# Altium footprint library 2.52-直插元件.PcbLib: 467 footprints (part 26 of 30)
Each footprint in its own frame and in the unit in brackets; x right, y up, seen from the top. Pads: shape width x height; smd on the part's side, far side on the other; paste and mask are expansions set on the pad; w line width, h text height; cw(c..) or ccw(c..) is an arc to the next point about the centre after c.
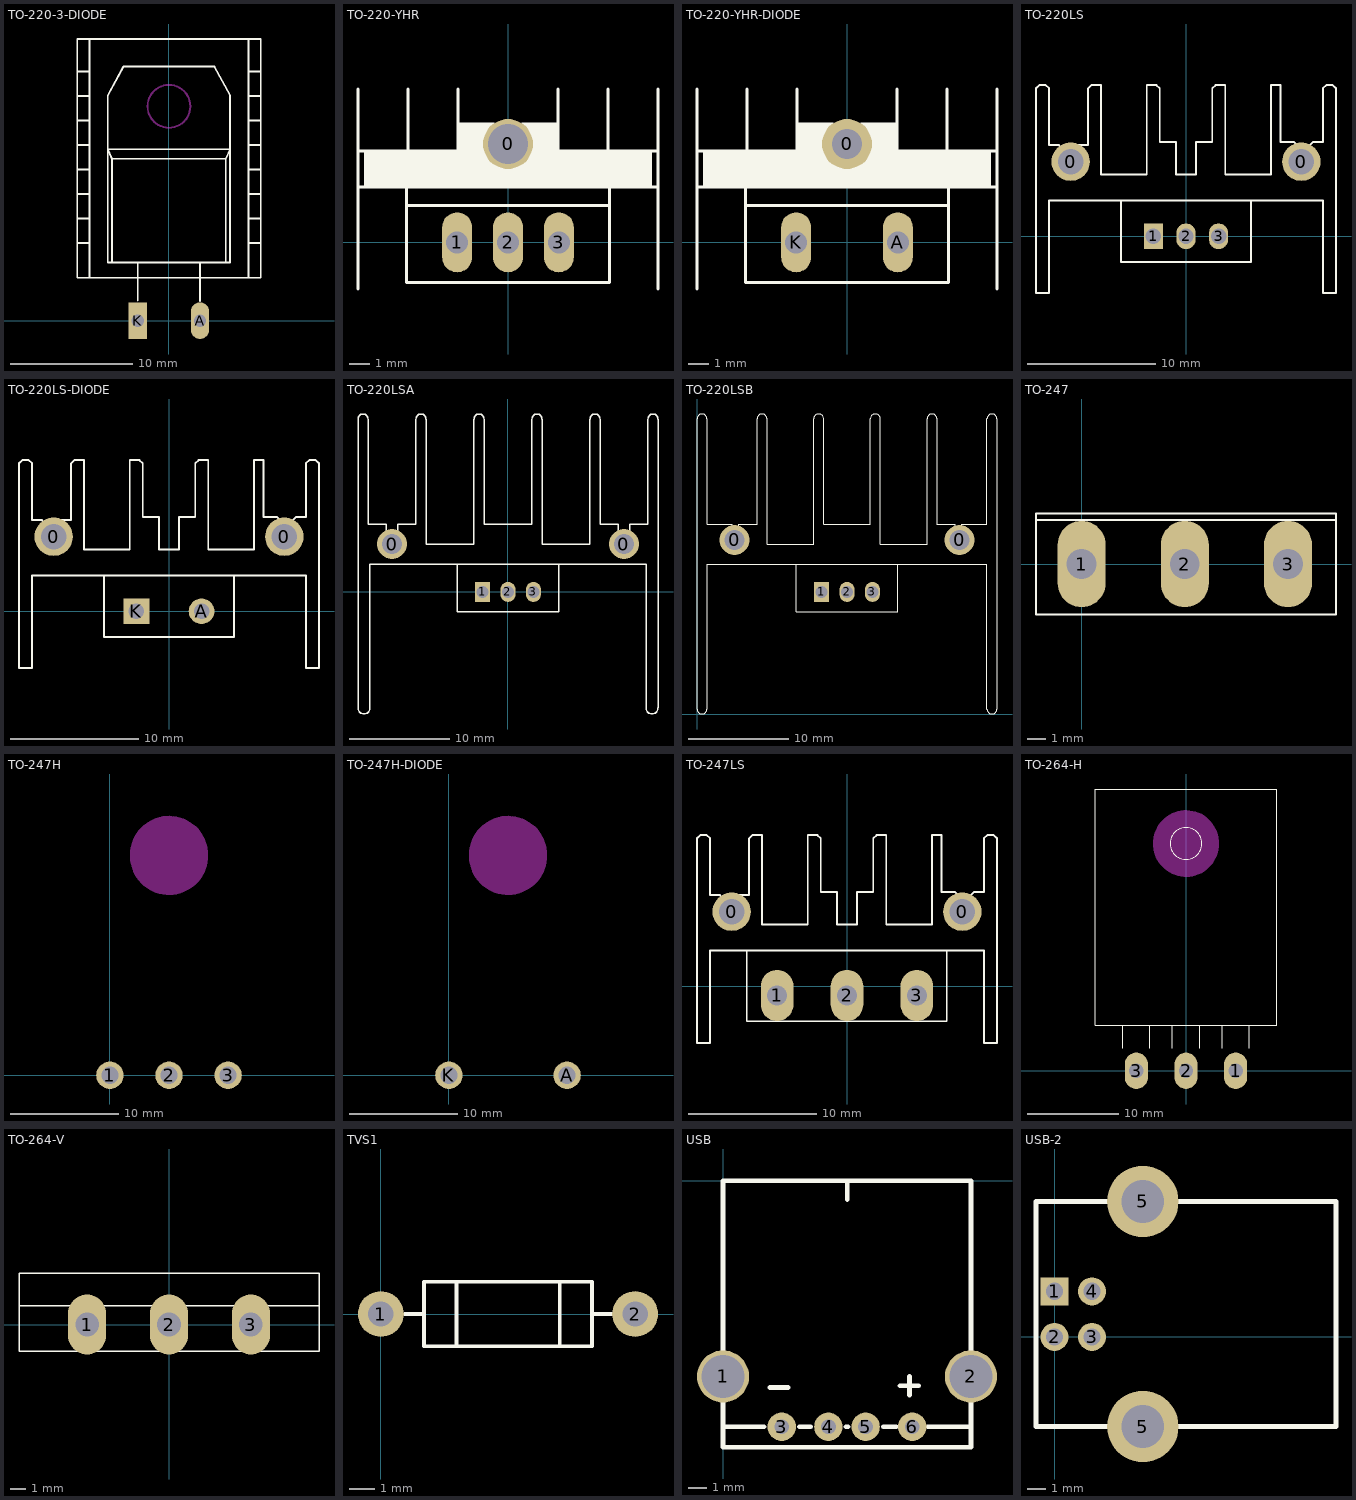
[diagram p25: the footprints below, top view; thin cyan lines are the x and y axes]

## TO-220-3-DIODE [mm]
pads (2):
  oval 1.5x3 hole 1: A(2.54,0)
  rect 1.5x3 hole 1: K(-2.54,0)
Top Overlay:
  lines w0.15: -7.493,6.343 -6.493,6.343 ; -7.493,8.343 -6.493,8.343 ; -7.493,10.343 -6.493,10.343 ; -7.493,12.343 -6.493,12.343 ; -7.493,14.343 -6.493,14.343 ; -7.493,16.343 -6.493,16.343 ; -7.493,18.343 -6.493,18.343 ; -7.493,20.343 -6.493,20.343 ; -6.493,3.505 -6.493,23.005 ; -5,14 5,14 ; -5,14.005 -4.644,13.217 ; -5,18.377 -5,4.75 5,4.75 5,18.377 ; -5,18.388 -3.712,20.75 3.712,20.75 5,18.388 ; -4.644,4.75 -4.644,13.217 ; -2.54,1.654 -2.54,4.75 ; 2.54,1.611 2.54,4.75 ; 4.644,4.75 4.644,13.217 ; 5,14.005 4.644,13.217 ; 6.507,3.505 6.507,23.005 ; 6.507,6.343 7.507,6.343 ; 6.507,8.343 7.507,8.343 ; 6.507,10.343 7.507,10.343 ; 6.507,12.343 7.507,12.343 ; 6.507,14.343 7.507,14.343 ; 6.507,16.343 7.507,16.343 ; 6.507,18.343 7.507,18.343 ; 6.507,20.343 7.507,20.343 ; -4.644,13.217 4.644,13.217 ; -7.493,3.505 7.507,3.505 7.507,23.005 -7.493,23.005 -7.493,3.505
Keep-Out Layer:
  circle w0.15: c0,17.5 r1.75
  circle w0.15: c0.007,17.505 r1.75
3D body "User Library-Disipador TO.step": height 10, standoff 0, extent -8.493,1.491 8.507,21.491

## TO-220-YHR [mm] "封装库来自淘宝卖家 ID：黄晶宝石"
pads (4):
  round 2.5 hole 2: 0(0,4.917)
  oval 1.5x3 hole 1.1: 1(-2.54,0) 2(0,0) 3(2.54,0)
Top Overlay:
  region: 2.5,5.994 0.667,5.994 0.667,4.039 2.5,4.039
  rectangle: -2.5,4.039 -0.667,5.994
  rectangle: -7.195,2.767 7.207,4.567
  lines w0.15: -7.5,-2.333 -7.5,7.667 ; -7.5,2.767 7.5,2.767 ; -7.5,4.567 7.5,4.567 ; -5.08,1.848 5.08,1.848 ; -5,4.567 -5,7.667 ; -2.5,4.567 -2.5,7.667 ; 2.5,4.567 2.5,7.667 ; 5,4.567 5,7.667 ; 7.5,-2.333 7.5,7.667 ; -5.08,-2 -5.08,2.79 5.08,2.79 5.08,-2 -5.08,-2
3D body "User Library-heatsink TO126.step": height 25, standoff -3.8, extent -7.391,-2.578 7.391,8.223

## TO-220-YHR-DIODE [mm] "封装库来自淘宝卖家 ID：黄晶宝石"
pads (3):
  round 2.5 hole 1.5: 0(0,4.917)
  oval 1.5x3 hole 1.1: A(2.54,0) K(-2.54,0)
Top Overlay:
  region: 2.5,5.994 0.667,5.994 0.667,4.039 2.5,4.039
  rectangle: -2.5,4.039 -0.667,5.994
  rectangle: -7.195,2.767 7.207,4.567
  lines w0.15: -7.5,-2.333 -7.5,7.667 ; -7.5,2.767 7.5,2.767 ; -7.5,4.567 7.5,4.567 ; -5.08,1.848 5.08,1.848 ; -5,4.567 -5,7.667 ; -2.5,4.567 -2.5,7.667 ; 2.5,4.567 2.5,7.667 ; 5,4.567 5,7.667 ; 7.5,-2.333 7.5,7.667 ; -5.08,-2 5.08,-2 5.08,2.79 -5.08,2.79 -5.08,-2
3D body "User Library-heatsink TO126.step": height 25, standoff -3.8, extent -7.391,-2.578 7.391,8.223

## TO-220LS [mm] "淘宝ID:黄晶宝石   店铺网址:https://shop463601444.taobao.com"
pads (5):
  round 3 hole 2: 0(-9,5.822) 0(9,5.822)
  rect 1.5x2 hole 1.2: 1(-2.54,0)
  oval 1.5x2 hole 1.2: 2(0,0) 3(2.54,0)
Top Overlay:
  lines w0.15: -9.668,6.018 -9.668,6.854 -9.922,7.108 -10.684,7.108 -10.684,11.536 -10.938,11.79 -11.446,11.79 -11.7,11.536 -11.7,2.79 -11.7,2.536 -11.7,-4.41 -10.684,-4.41 -10.684,2.79 10.684,2.79 10.684,-4.41 11.7,-4.41 11.7,11.536 11.446,11.79 10.938,11.79 10.684,11.536 10.684,7.362 9.922,7.362 9.668,7.108 9.668,6.079 ; -8.652,6.346 -8.652,6.854 -8.398,7.108 -7.636,7.108 -7.636,11.536 -7.382,11.79 -6.62,11.79 -6.62,4.822 -3.064,4.822 -3.064,11.79 -2.302,11.79 -2.048,11.536 -2.048,7.362 -0.778,7.362 -0.778,4.822 0.778,4.822 0.778,7.362 2.048,7.362 2.048,11.536 2.302,11.79 3.064,11.79 3.064,4.822 6.62,4.822 6.62,11.79 7.382,11.79 7.382,7.362 8.398,7.362 8.652,7.108 8.652,6.346 ; -5.08,2.79 -5.08,-2 5.08,-2 5.08,2.79
3D body "User Library-M3x8.STEP": height 20.6, standoff 15, extent -2.8,-0.35 2.8,9.135
3D body "User Library-POWER MOSFET, NON-SURFACE-MOUNT.step": height 20.8, standoff -7.58, extent -4.834,-1.996 4.818,2.504
3D body "User Library-heat sink-1.step": height 30.62, standoff 0, extent -11.45,-4.535 11.45,11.865

## TO-220LS-DIODE [mm]
pads (4):
  round 3 hole 2: 0(-9,5.822) 0(9,5.822)
  round 2 hole 1.2: A(2.54,0)
  rect 2x2 hole 1.2: K(-2.54,0)
Top Overlay:
  lines w0.15: -9.668,6.018 -9.668,6.854 -9.922,7.108 -10.684,7.108 -10.684,11.536 -10.938,11.79 -11.446,11.79 -11.7,11.536 -11.7,2.79 -11.7,2.536 -11.7,-4.41 -10.684,-4.41 -10.684,2.79 10.684,2.79 10.684,-4.41 11.7,-4.41 11.7,11.536 11.446,11.79 10.938,11.79 10.684,11.536 10.684,7.362 9.922,7.362 9.668,7.108 9.668,6.079 ; -8.652,6.346 -8.652,6.854 -8.398,7.108 -7.636,7.108 -7.636,11.536 -7.382,11.79 -6.62,11.79 -6.62,4.822 -3.064,4.822 -3.064,11.79 -2.302,11.79 -2.048,11.536 -2.048,7.362 -0.778,7.362 -0.778,4.822 0.778,4.822 0.778,7.362 2.048,7.362 2.048,11.536 2.302,11.79 3.064,11.79 3.064,4.822 6.62,4.822 6.62,11.79 7.382,11.79 7.382,7.362 8.398,7.362 8.652,7.108 8.652,6.346 ; -5.08,2.79 -5.08,-2 5.08,-2 5.08,2.79
3D body "User Library-heat sink-1.step": height 30.62, standoff 0, extent -11.45,-4.535 11.45,11.865
3D body "User Library-TO220-D.STEP": height 20.8, standoff -7.58, extent -4.826,-2.075 4.826,2.425
3D body "User Library-M3x8.STEP": height 20.6, standoff 15, extent -2.8,-0.35 2.8,9.135

## TO-220LSA [mm]
pads (5):
  round 3 hole 2: 0(-11.6,4.79) 0(11.6,4.79)
  rect 1.5x2 hole 1.2: 1(-2.54,0)
  oval 1.5x2 hole 1.2: 2(0,0) 3(2.54,0)
Top Overlay:
  lines w0.15: -12.156,5.446 ccw(c-11.6,4.79) -11.035,5.438 ; -12.154,5.446 -12.154,6.79 -14,6.79 -14,17.29 ccw(c-14.5,17.29) -15,17.29 -15,2.79 -15,-11.61 ccw(c-14.4,-11.61) -13.8,-11.61 -13.8,2.79 13.8,2.79 13.8,-11.61 ccw(c14.4,-11.61) 15,-11.61 15,2.79 15,17.29 ccw(c14.5,17.29) 14,17.29 14,6.79 12.154,6.79 12.154,5.438 ; -11.046,5.438 -11.046,6.79 -9.2,6.79 -9.2,17.29 cw(c-8.7,17.29) -8.2,17.29 -8.2,4.79 -3.4,4.79 -3.4,17.29 cw(c-2.9,17.29) -2.4,17.29 -2.4,6.79 2.4,6.79 2.4,17.29 cw(c2.9,17.29) 3.4,17.29 3.4,4.79 8.2,4.79 8.2,17.29 cw(c8.7,17.29) 9.2,17.29 9.2,6.79 11.046,6.79 11.046,5.446 ; -5.08,2.79 -5.08,-2 5.08,-2 5.08,2.79 ; 11.044,5.446 ccw(c11.6,4.79) 12.165,5.438
3D body "User Library-POWER MOSFET, NON-SURFACE-MOUNT.step": height 20.8, standoff -7.58, extent -4.834,-1.996 4.818,2.504
3D body "User Library-M3x8.STEP": height 20.6, standoff 15, extent -2.8,-0.35 2.8,9.135

## TO-220LSB [mm]
pads (5):
  round 3 hole 2: 0(3.75,17.4) 0(26.25,17.4)
  rect 1.5x2 hole 1.2: 1(12.468,12.21)
  oval 1.5x2 hole 1.2: 2(15.008,12.21) 3(17.548,12.21)
Top Overlay:
  lines w0.1: 9.928,15 9.928,10.21 20.088,10.21 20.088,15 ; 24,18.992 25.8,18.992 25.8,17.861 ccw(c26.25,17.392) 26.5,17.992 ; 24,19 24,29.5 ccw(c23.5,29.5) 23,29.5 23,17 18.333,17 18.333,29.5 ccw(c17.833,29.5) 17.333,29.5 17.333,19 12.667,19 12.667,29.5 ccw(c12.167,29.5) 11.667,29.5 11.667,17 7,17 7,29.5 ccw(c6.5,29.5) 6,29.5 6,19 4.2,19 4.2,17.869 cw(c3.75,17.4) 3.5,18 3.5,19 1,19 1,19.01 1,29.5 ccw(c0.5,29.5) 0,29.5 0,0.5 ccw(c0.5,0.5) 1,0.5 1,15 29,15 29,0.5 ccw(c29.5,0.5) 30,0.5 30,29.5 ccw(c29.5,29.5) 29,29.5 29,19.002 ; 26.5,17.992 26.5,18.992 29,18.992 29,19.002 ; 29,19 29,19.002
3D body "User Library-M3x8.STEP": height 20.6, standoff 15, extent 12.2,11.86 17.8,21.345
3D body "User Library-POWER MOSFET, NON-SURFACE-MOUNT.step": height 20.8, standoff -7.58, extent 10.174,10.214 19.826,14.714
3D body: height 8, standoff -5, extent 25.5,16.643 26.994,18.14
3D body: height 8, standoff -5, extent 3.006,16.652 4.5,18.149
3D body: height 25, standoff 0, extent 29,0.5 30,29.5
3D body: height 25, standoff 0, extent 0.004,0.5 1,29.5
3D body: height 25, standoff 0, extent 4.2,17.869 6,19
3D body: height 25, standoff 0, extent 1,18 3.5,19
3D body: height 25, standoff 0, extent 1,15.008 3.74,17.405
3D body: height 25, standoff 0, extent 3.74,15.008 6,17.413
3D body: height 25, standoff 0, extent 4.2,17.413 6,17.869
3D body: height 25, standoff 0, extent 1,17.405 3.5,18
3D body: height 25, standoff 0, extent 26.5,17.397 29,17.992
3D body: height 25, standoff 0, extent 24,17.405 25.8,17.861
3D body: height 25, standoff 0, extent 24,15 26.26,17.405
3D body: height 25, standoff 0, extent 26.26,15 29,17.397
3D body: height 25, standoff 0, extent 26.5,17.992 29,18.992
3D body: height 25, standoff 0, extent 24,17.861 25.8,18.992
3D body: height 25, standoff 0, extent 6,14.993 24,29.5
3D body: height 25, standoff 0, extent 0.004,0.001 1,0.999
3D body: height 25, standoff 0, extent 29.004,0.001 30,0.999
3D body: height 25, standoff 0, extent 29.004,29.001 30,29.999
3D body: height 25, standoff 0, extent 23.004,29.001 24,29.999
3D body: height 25, standoff 0, extent 17.337,29.001 18.333,29.999
3D body: height 25, standoff 0, extent 11.671,29.001 12.667,29.999
3D body: height 25, standoff 0, extent 6.004,29.001 7,29.999
3D body: height 25, standoff 0, extent 0.004,29.001 1,29.999

## TO-247 [mil]
pads (3):
  oval 100x180 hole 62: 1(0,0) 2(215,0) 3(430,0)
Top Overlay:
  lines w3.94: -95,91.42 529.33,91.42 530,90.75 ; -95,-105 -95,105 530,105 530,-105 -95,-105
3D body "User Library-IRFP2907.step": height 984.25, standoff -387.64, extent -90.12,-98.43 520.12,98.43

## TO-247H [mm]
pads (3):
  round 2.54 hole 1.575: 1(0,0) 2(5.461,0) 3(10.922,0)
Bottom Overlay:
  circle w0.2: c5.461,20.32 r1.5
  lines w0.2: -2.794,16.51 -0.889,18.415 ; -2.794,17.357 -1.524,18.627 ; -2.794,23.283 -1.524,22.013 ; -2.794,24.13 -0.889,22.225 ; -2.794,24.765 13.716,24.765 ; -1.312,1.905 -1.312,5.08 ; 1.228,1.905 1.228,5.08 ; 4.191,1.905 4.191,5.08 ; 6.731,1.905 6.731,5.08 ; 9.694,1.905 9.694,5.08 ; 12.234,1.905 12.234,5.08 ; 13.716,16.51 11.811,18.415 ; 13.716,17.357 12.446,18.627 ; 13.716,23.283 12.446,22.013 ; 13.716,24.13 11.811,22.225 ; -1.524,18.627 -0.889,18.415 ; -1.524,18.627 -1.524,22.013 ; -1.524,22.013 -0.889,22.225 ; -0.889,18.415 -0.889,22.225 ; 11.811,18.415 12.446,18.627 ; 11.811,18.415 11.811,22.225 ; 11.811,22.225 12.446,22.013 ; 12.446,18.627 12.446,22.013 ; -2.794,5.08 -2.794,26.458 13.716,26.458 13.716,5.08 -2.794,5.08
  text "1" at 0.254,3.048 h1.27
  text "2" at 5.842,3.048 h1.27
  text "3" at 11.43,3.048 h1.27
Keep-Out Layer:
  board cut-out: 9.061,20.326 9.061,20.561 8.999,21.028 8.878,21.482 8.697,21.917 8.462,22.324 8.176,22.697 7.843,23.03 7.47,23.317 7.062,23.552 6.628,23.732 6.173,23.854 5.707,23.915 5.472,23.915 5.451,23.915 5.216,23.915 4.749,23.854 4.294,23.732 3.86,23.552 3.452,23.316 3.079,23.03 2.746,22.697 2.46,22.324 2.224,21.916 2.044,21.481 1.922,21.027 1.861,20.56 1.861,20.325 1.861,20.089 1.923,19.621 2.045,19.165 2.225,18.729 2.461,18.321 2.748,17.946 3.082,17.613 3.457,17.325 3.865,17.089 4.301,16.909 4.757,16.787 5.225,16.725 5.461,16.725 5.481,16.725 5.716,16.725 6.181,16.786 6.634,16.908 7.068,17.087 7.474,17.322 7.846,17.608 8.178,17.939 8.464,18.312 8.698,18.718 8.878,19.152 8.999,19.605 9.061,20.07 9.061,20.305
Keep-Out Layer:
  circle w0.1: c5.461,20.32 r3.6
3D body "TO-247H.STEP": height 8, standoff -3.9, extent -2.289,-0.3 13.211,25.82

## TO-247H-DIODE [mm]
pads (2):
  round 2.54 hole 1.575: A(10.922,0) K(0,0)
Bottom Overlay:
  circle w0.2: c5.461,20.32 r3.7
  lines w0.2: -2.794,16.51 -0.889,18.415 ; -2.794,17.357 -1.524,18.627 ; -2.794,23.283 -1.524,22.013 ; -2.794,24.13 -0.889,22.225 ; -2.794,24.765 13.716,24.765 ; -1.312,1.905 -1.312,5.08 ; 1.228,1.905 1.228,5.08 ; 4.191,1.905 4.191,5.08 ; 6.731,1.905 6.731,5.08 ; 9.694,1.905 9.694,5.08 ; 12.234,1.905 12.234,5.08 ; 13.716,16.51 11.811,18.415 ; 13.716,17.357 12.446,18.627 ; 13.716,23.283 12.446,22.013 ; 13.716,24.13 11.811,22.225 ; -1.524,18.627 -1.524,22.013 ; -1.524,18.627 -0.889,18.415 ; -1.524,22.013 -0.889,22.225 ; -0.889,18.415 -0.889,22.225 ; 11.811,18.415 11.811,22.225 ; 11.811,18.415 12.446,18.627 ; 11.811,22.225 12.446,22.013 ; 12.446,18.627 12.446,22.013 ; -2.794,5.08 13.716,5.08 13.716,26.458 -2.794,26.458 -2.794,5.08
  text "3" at 11.43,3.048 h1.27
  text "2" at 5.842,3.048 h1.27
  text "1" at 0.254,3.048 h1.27
Keep-Out Layer:
  board cut-out: 9.061,20.326 9.061,20.561 8.999,21.028 8.878,21.482 8.697,21.917 8.462,22.324 8.176,22.697 7.843,23.03 7.47,23.317 7.062,23.552 6.628,23.732 6.173,23.854 5.707,23.915 5.472,23.915 5.451,23.915 5.216,23.915 4.749,23.854 4.294,23.732 3.86,23.552 3.452,23.316 3.079,23.03 2.746,22.697 2.46,22.324 2.224,21.916 2.044,21.481 1.922,21.027 1.861,20.56 1.861,20.325 1.861,20.089 1.923,19.621 2.045,19.165 2.225,18.729 2.461,18.321 2.748,17.946 3.082,17.613 3.457,17.325 3.865,17.089 4.301,16.909 4.757,16.787 5.225,16.725 5.461,16.725 5.481,16.725 5.716,16.725 6.181,16.786 6.634,16.908 7.068,17.087 7.474,17.322 7.846,17.608 8.178,17.939 8.464,18.312 8.698,18.718 8.878,19.152 8.999,19.605 9.061,20.07 9.061,20.305
Keep-Out Layer:
  circle w0.1: c5.461,20.32 r3.6
3D body "TO-247D.STEP": height 1.9, standoff -10, extent -2.289,-0.3 13.211,25.82

## TO-247LS [mm]
pads (5):
  round 3 hole 2: 0(-9,5.822) 0(9,5.822)
  oval 2.54x4 hole 1.575: 1(-5.45,-0.71) 2(0,-0.71) 3(5.45,-0.71)
Top Overlay:
  lines w0.1: -7.8,2.79 -7.8,-2.71 7.8,-2.71 7.8,2.79
  lines w0.15: -9.668,6.018 -9.668,6.854 -9.922,7.108 -10.684,7.108 -10.684,11.536 -10.938,11.79 -11.446,11.79 -11.7,11.536 -11.7,2.79 -11.7,2.536 -11.7,-4.41 -10.684,-4.41 -10.684,2.79 10.684,2.79 10.684,-4.41 11.7,-4.41 11.7,11.536 11.446,11.79 10.938,11.79 10.684,11.536 10.684,7.362 9.922,7.362 9.668,7.108 9.668,6.079 ; -8.652,6.346 -8.652,6.854 -8.398,7.108 -7.636,7.108 -7.636,11.536 -7.382,11.79 -6.62,11.79 -6.62,4.822 -3.064,4.822 -3.064,11.79 -2.302,11.79 -2.048,11.536 -2.048,7.362 -0.778,7.362 -0.778,4.822 0.778,4.822 0.778,7.362 2.048,7.362 2.048,11.536 2.302,11.79 3.064,11.79 3.064,4.822 6.62,4.822 6.62,11.79 7.382,11.79 7.382,7.362 8.398,7.362 8.652,7.108 8.652,6.346
3D body "User Library-heat sink-1.step": height 30.62, standoff 0, extent -11.45,-4.485 11.45,11.915
3D body "User Library-M3x8.STEP": height 20.6, standoff 15, extent -2.8,-4.235 2.8,5.25
3D body "2SK2225.STEP": height 23, standoff -17.9, extent -7.767,-2.697 7.833,2.803

## TO-264-H [mil] "淘宝ID:黄晶宝石   店铺网址:https://shop463601444.taobao.com"
pads (3):
  oval 100x157.48 hole 62: 1(215,0) 2(0,0) 3(-215,0)
Top Overlay:
  circle w3.94: c0,984.25 r68.9
  lines w3.94: -274.06,98.43 -274.06,196.85 ; -155.94,98.43 -155.94,196.85 ; -59.06,98.43 -59.06,196.85 ; 59.06,98.43 59.06,196.85 ; 155.94,98.43 155.94,196.85 ; 274.06,98.43 274.06,196.85 ; -393.7,196.85 -393.7,1220.47 393.7,1220.47 393.7,196.85 -393.7,196.85
Keep-Out Layer:
  board cut-out: 141.73,984.48 141.73,993.74 139.31,1012.11 134.52,1030 127.43,1047.11 118.17,1063.16 106.89,1077.85 93.79,1090.95 79.1,1102.23 63.06,1111.49 45.94,1118.58 28.05,1123.37 9.69,1125.79 0.42,1125.79 -0.39,1125.79 -9.65,1125.79 -28.02,1123.37 -45.92,1118.57 -63.04,1111.48 -79.08,1102.22 -93.78,1090.94 -106.88,1077.84 -118.16,1063.14 -127.42,1047.1 -134.51,1029.98 -139.31,1012.08 -141.73,993.71 -141.73,984.45 -141.73,975.16 -139.3,956.74 -134.49,938.79 -127.38,921.63 -118.09,905.54 -106.78,890.8 -93.65,877.66 -78.91,866.35 -62.82,857.06 -45.65,849.95 -27.71,845.14 -9.29,842.72 0,842.72 0.79,842.72 10.03,842.72 28.35,845.13 46.19,849.91 63.26,856.98 79.26,866.22 93.92,877.46 106.98,890.53 118.23,905.19 127.47,921.19 134.54,938.25 139.32,956.1 141.73,974.42 141.73,983.65
Keep-Out Layer:
  circle w3.94: c0,984.25 r141.73
3D body "User Library-to264.STEP": height 393.7, standoff -318.9, extent -403.55,-9.02 403.54,1222.44

## TO-264-V [mil]
pads (3):
  oval 100x157.48 hole 62: 1(-215,0) 2(0,0) 3(215,0)
Top Overlay:
  lines w3.94: -393.7,49.21 393.7,49.21 ; -393.7,-70.87 393.7,-70.87 393.7,133.86 -393.7,133.86 -393.7,-70.87
3D body "User Library-to264.STEP": height 1170.26, standoff -639.94, extent -403.54,-70.87 403.54,133.86

## TVS1 [mm]
pads (2):
  round 1.8 hole 1: 1(0,0) 2(10,0)
Top Overlay:
  lines w0.15: 0.939,0 1.701,0 ; 2.971,-1.27 2.971,1.27 ; 7.035,-1.27 7.035,1.27 ; 8.305,0 9.067,0 ; 1.701,-1.27 8.305,-1.27 8.305,1.27 1.701,1.27 1.701,-1.27
3D body "TVS.STEP": height 2.86, standoff -2.5, extent -0.397,-1.362 10.403,1.362

## USB [mm]
pads (6):
  round 2.8 hole 2.3: 1(0,-10.5) 2(13.3,-10.5)
  round 1.524 hole 0.8: 3(3.15,-13.2) 4(5.65,-13.2) 5(7.65,-13.2) 6(10.15,-13.2)
Top Overlay:
  lines w0.254: 0,-13.2 2.2,-13.2 ; 2.5,-11.1 3.5,-11.1 ; 4.1,-13.2 4.7,-13.2 ; 6.6,-13.2 6.7,-13.2 ; 6.66,-1 6.66,0 ; 8.6,-13.2 9.3,-13.2 ; 9.5,-11 10.5,-11 ; 10,-11.5 10,-10.5 ; 11,-13.2 13.3,-13.2 ; 0,-14.3 0,0 13.3,0 13.3,-14.3 0,-14.3
3D body "Samtec-USBR-A-S-S-O-TH.STEP": height 7.55, standoff -3.3, extent -1.245,-14.3 14.555,-0.14

## USB-2 [mm] "Connector; USB1.1, Type B, Thru-Hole; 4 Position; Right Angle"
height 11.05
pads (6):
  rect 1.5x1.5 hole 0.92: 1(0,2.413)
  round 1.5 hole 0.92: 2(0,-0.017) 3(2,-0.017) 4(2,2.413)
  round 3.8 hole 2.28: 5(4.713,-4.794) 5(4.713,7.206)
Top Overlay:
  lines w0.254: -0.987,-4.794 -0.987,7.206 15.013,7.206 15.013,-4.794 -0.987,-4.794
3D body "USB-B.step": height 3.13, standoff -11.09, extent -0.914,-6.312 15.386,8.547